# Altium footprint library ACTION_Connector.PcbLib: 123 footprints (part 7 of 8)
Each footprint in its own frame and in the unit in brackets; x right, y up, seen from the top. Pads: shape width x height; smd on the part's side, far side on the other; paste and mask are expansions set on the pad; w line width, h text height; cw(c..) or ccw(c..) is an arc to the next point about the centre after c.
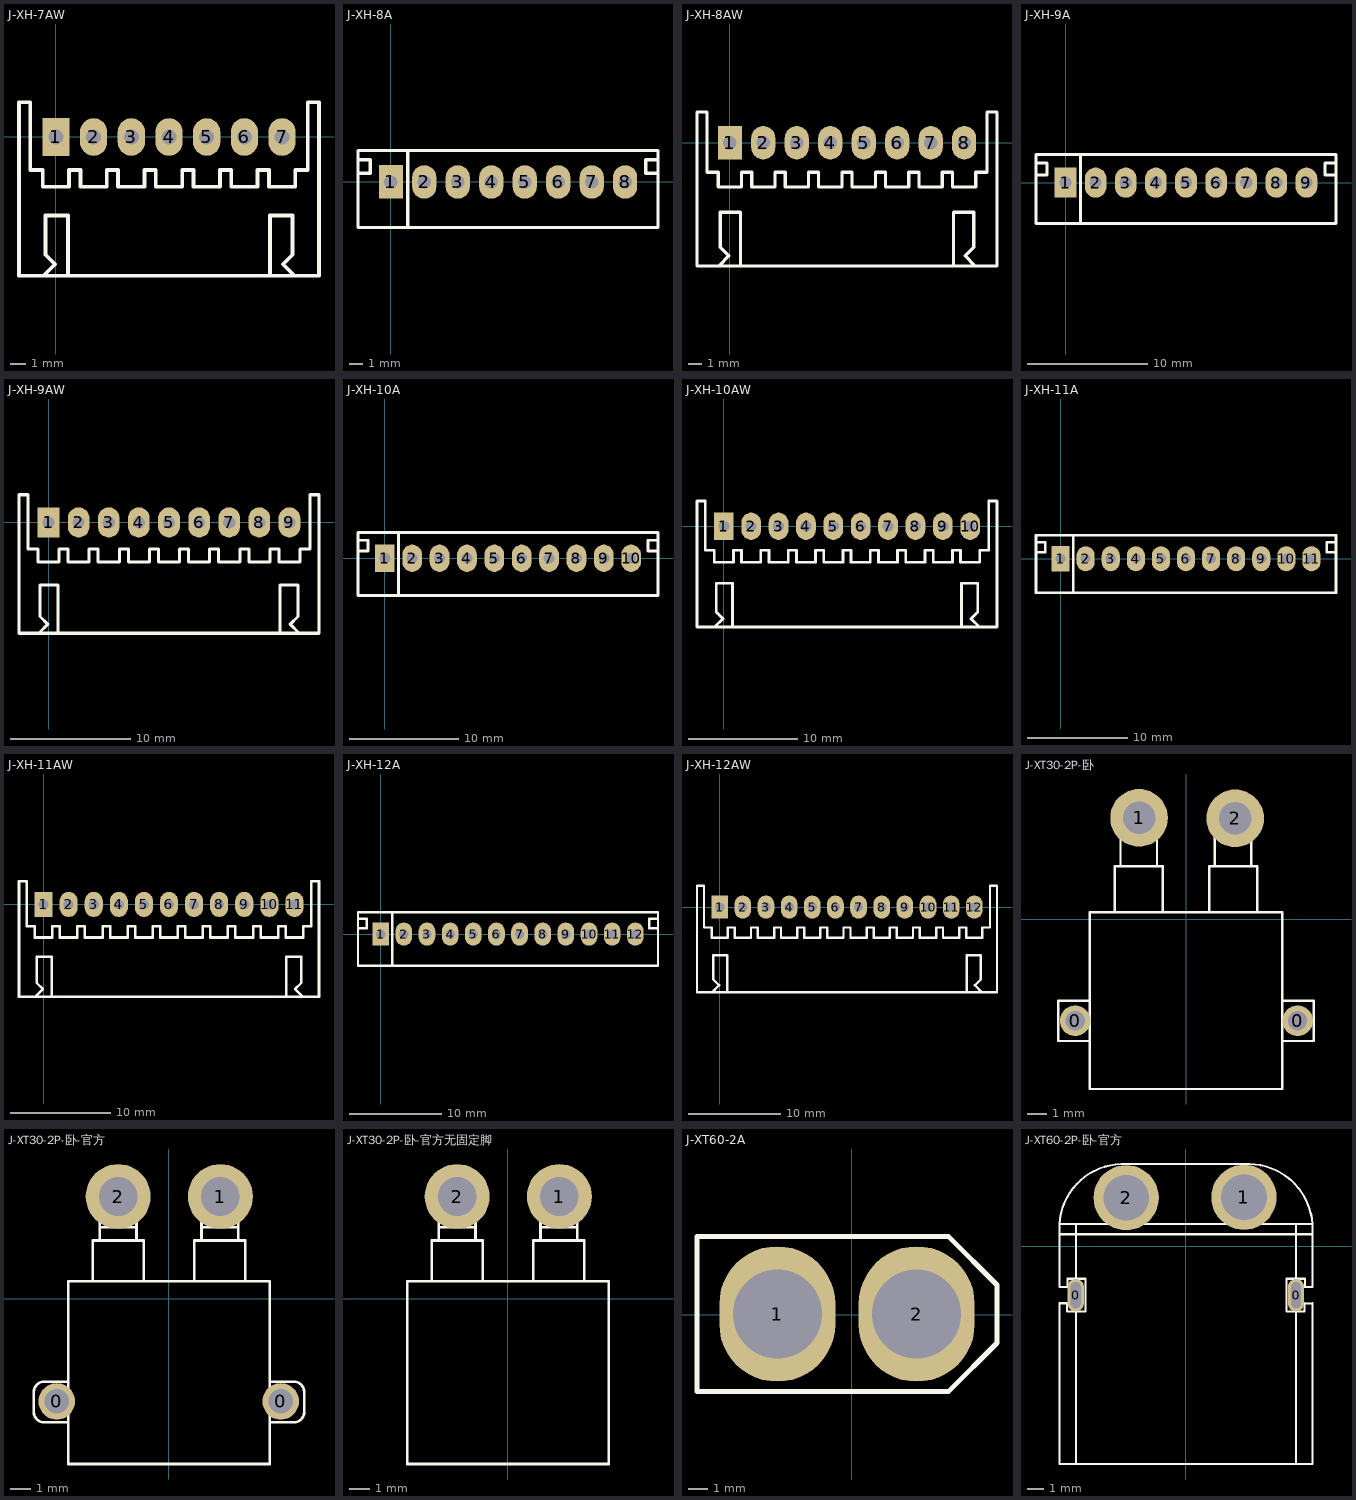
[diagram p6: the footprints below, top view; thin cyan lines are the x and y axes]

## J-XH-7AW [mm]
pads (7):
  rect 1.8x2.5 hole 1: 1(0,0)
  oval 1.8x2.5 hole 1: 2(2.5,0) 3(5,0) 4(7.5,0) 5(10,0) 6(12.5,0) 7(15,0)
Top Overlay:
  lines w0.254: -0.79,-9.172 -0.064,-8.445 -0.7,-7.809 -0.7,-5.2 0.8,-5.2 0.8,-9.2 ; 14.2,-9.2 14.2,-5.2 15.7,-5.2 15.7,-7.809 15.064,-8.445 15.79,-9.172 ; -2.45,-9.2 17.45,-9.2 17.45,2.3 16.7,2.3 16.7,-2.2 15.875,-2.2 15.875,-3.3 14.125,-3.3 14.125,-2.2 13.375,-2.2 13.375,-3.3 11.625,-3.3 11.625,-2.2 10.875,-2.2 10.875,-3.3 9.125,-3.3 9.125,-2.2 8.375,-2.2 8.375,-3.3 6.625,-3.3 6.625,-2.2 5.875,-2.2 5.875,-3.3 4.125,-3.3 4.125,-2.2 3.375,-2.2 3.375,-3.3 1.625,-3.3 1.625,-2.2 0.875,-2.2 0.875,-3.3 -0.875,-3.3 -0.875,-2.2 -1.7,-2.2 -1.7,2.3 -2.45,2.3 -2.45,-9.2
3D body "JST-S7B-XH-A.STEP": height 6.1, standoff -3.4, extent -2.45,-9.2 17.45,2.3

## J-XH-8A [mm]
pads (8):
  rect 1.8x2.5 hole 1: 1(0,0)
  oval 1.8x2.5 hole 1: 2(2.5,0) 3(5,0) 4(7.5,0) 5(10,0) 6(12.5,0) 7(15,0) 8(17.5,0)
Top Overlay:
  lines w0.254: -2.45,0.65 -1.524,0.65 -1.524,1.65 -2.45,1.65 ; 1.25,-3.4 1.25,2.35 ; 19.95,0.65 19.024,0.65 19.024,1.65 19.95,1.65 ; -2.45,-3.4 19.95,-3.4 19.95,2.35 -2.45,2.35 -2.45,-3.4
3D body "JST-B8B-XH-A.STEP": height 7, standoff -3.4, extent -2.45,-3.4 19.95,2.35

## J-XH-8AW [mm]
pads (8):
  rect 1.8x2.5 hole 1: 1(0,0)
  oval 1.8x2.5 hole 1: 2(2.5,0) 3(5,0) 4(7.5,0) 5(10,0) 6(12.5,0) 7(15,0) 8(17.5,0)
Top Overlay:
  lines w0.254: -0.79,-9.172 -0.064,-8.445 -0.7,-7.809 -0.7,-5.2 0.8,-5.2 0.8,-9.2 ; 16.7,-9.2 16.7,-5.2 18.2,-5.2 18.2,-7.809 17.564,-8.445 18.29,-9.172 ; -2.45,-9.2 19.95,-9.2 19.95,2.3 19.2,2.3 19.2,-2.2 18.375,-2.2 18.375,-3.3 16.625,-3.3 16.625,-2.2 15.875,-2.2 15.875,-3.3 14.125,-3.3 14.125,-2.2 13.375,-2.2 13.375,-3.3 11.625,-3.3 11.625,-2.2 10.875,-2.2 10.875,-3.3 9.125,-3.3 9.125,-2.2 8.375,-2.2 8.375,-3.3 6.625,-3.3 6.625,-2.2 5.875,-2.2 5.875,-3.3 4.125,-3.3 4.125,-2.2 3.375,-2.2 3.375,-3.3 1.625,-3.3 1.625,-2.2 0.875,-2.2 0.875,-3.3 -0.875,-3.3 -0.875,-2.2 -1.7,-2.2 -1.7,2.3 -2.45,2.3 -2.45,-9.2
3D body "JST-S8B-XH-A.STEP": height 6.1, standoff -3.4, extent -2.45,-9.2 19.95,2.3

## J-XH-9A [mm]
pads (9):
  rect 1.8x2.5 hole 1: 1(0,0)
  oval 1.8x2.5 hole 1: 2(2.5,0) 3(5,0) 4(7.5,0) 5(10,0) 6(12.5,0) 7(15,0) 8(17.5,0) 9(20,0)
Top Overlay:
  lines w0.254: -2.45,0.65 -1.524,0.65 -1.524,1.65 -2.45,1.65 ; 1.25,-3.4 1.25,2.35 ; 22.45,0.65 21.524,0.65 21.524,1.65 22.45,1.65 ; -2.45,-3.4 -2.45,2.35 22.45,2.35 22.45,-3.4 -2.45,-3.4
3D body "JST-B9B-XH-A.STEP": height 7, standoff -3.4, extent -2.45,-3.4 22.45,2.35

## J-XH-9AW [mm]
pads (9):
  rect 1.8x2.5 hole 1: 1(0,0)
  oval 1.8x2.5 hole 1: 2(2.5,0) 3(5,0) 4(7.5,0) 5(10,0) 6(12.5,0) 7(15,0) 8(17.5,0) 9(20,0)
Top Overlay:
  lines w0.254: -0.79,-9.172 -0.064,-8.445 -0.7,-7.809 -0.7,-5.2 0.8,-5.2 0.8,-9.2 ; 19.2,-9.2 19.2,-5.2 20.7,-5.2 20.7,-7.809 20.064,-8.445 20.79,-9.172 ; -2.45,-9.2 -2.45,2.3 -1.7,2.3 -1.7,-2.2 -0.875,-2.2 -0.875,-3.3 0.875,-3.3 0.875,-2.2 1.625,-2.2 1.625,-3.3 3.375,-3.3 3.375,-2.2 4.125,-2.2 4.125,-3.3 5.875,-3.3 5.875,-2.2 6.625,-2.2 6.625,-3.3 8.375,-3.3 8.375,-2.2 9.125,-2.2 9.125,-3.3 10.875,-3.3 10.875,-2.2 11.625,-2.2 11.625,-3.3 13.375,-3.3 13.375,-2.2 14.125,-2.2 14.125,-3.3 15.875,-3.3 15.875,-2.2 16.625,-2.2 16.625,-3.3 18.375,-3.3 18.375,-2.2 19.125,-2.2 19.125,-3.3 20.875,-3.3 20.875,-2.2 21.7,-2.2 21.7,2.3 22.45,2.3 22.45,-9.2 -2.45,-9.2
3D body "JST-S9B-XH-A.STEP": height 6.1, standoff -3.4, extent -2.45,-9.2 22.45,2.3

## J-XH-10A [mm]
pads (10):
  rect 1.8x2.5 hole 1: 1(0,0)
  oval 1.8x2.5 hole 1: 2(2.5,0) 3(5,0) 4(7.5,0) 5(10,0) 6(12.5,0) 7(15,0) 8(17.5,0) 9(20,0) 10(22.5,0)
Top Overlay:
  lines w0.254: -2.45,0.65 -1.524,0.65 -1.524,1.65 -2.45,1.65 ; 1.25,-3.4 1.25,2.35 ; 24.95,0.65 24.024,0.65 24.024,1.65 24.95,1.65 ; -2.45,-3.4 24.95,-3.4 24.95,2.35 -2.45,2.35 -2.45,-3.4
3D body "JST-B10B-XH-A.STEP": height 7, standoff -3.4, extent -2.45,-3.4 24.95,2.35

## J-XH-10AW [mm]
pads (10):
  rect 1.8x2.5 hole 1: 1(0,0)
  oval 1.8x2.5 hole 1: 2(2.5,0) 3(5,0) 4(7.5,0) 5(10,0) 6(12.5,0) 7(15,0) 8(17.5,0) 9(20,0) 10(22.5,0)
Top Overlay:
  lines w0.254: -0.79,-9.172 -0.064,-8.445 -0.7,-7.809 -0.7,-5.2 0.8,-5.2 0.8,-9.2 ; 21.7,-9.2 21.7,-5.2 23.2,-5.2 23.2,-7.809 22.564,-8.445 23.29,-9.172 ; -2.45,-9.2 24.95,-9.2 24.95,2.3 24.2,2.3 24.2,-2.2 23.375,-2.2 23.375,-3.3 21.625,-3.3 21.625,-2.2 20.875,-2.2 20.875,-3.3 19.125,-3.3 19.125,-2.2 18.375,-2.2 18.375,-3.3 16.625,-3.3 16.625,-2.2 15.875,-2.2 15.875,-3.3 14.125,-3.3 14.125,-2.2 13.375,-2.2 13.375,-3.3 11.625,-3.3 11.625,-2.2 10.875,-2.2 10.875,-3.3 9.125,-3.3 9.125,-2.2 8.375,-2.2 8.375,-3.3 6.625,-3.3 6.625,-2.2 5.875,-2.2 5.875,-3.3 4.125,-3.3 4.125,-2.2 3.375,-2.2 3.375,-3.3 1.625,-3.3 1.625,-2.2 0.875,-2.2 0.875,-3.3 -0.875,-3.3 -0.875,-2.2 -1.7,-2.2 -1.7,2.3 -2.45,2.3 -2.45,-9.2
3D body "JST-S10B-XH-A.STEP": height 6.1, standoff -3.4, extent -2.45,-9.2 24.95,2.3

## J-XH-11A [mm]
pads (11):
  rect 1.8x2.5 hole 1: 1(0,0)
  oval 1.8x2.5 hole 1: 2(2.5,0) 3(5,0) 4(7.5,0) 5(10,0) 6(12.5,0) 7(15,0) 8(17.5,0) 9(20,0) 10(22.5,0) 11(25,0)
Top Overlay:
  lines w0.254: -2.45,0.65 -1.524,0.65 -1.524,1.65 -2.45,1.65 ; 1.25,-3.4 1.25,2.35 ; 27.45,0.65 26.524,0.65 26.524,1.65 27.45,1.65 ; -2.45,-3.4 -2.45,2.35 27.45,2.35 27.45,-3.4 -2.45,-3.4
3D body "JST-B11B-XH-A.STEP": height 7, standoff -3.4, extent -2.45,-3.4 27.45,2.35

## J-XH-11AW [mm]
pads (11):
  rect 1.8x2.5 hole 1: 1(0,0)
  oval 1.8x2.5 hole 1: 2(2.5,0) 3(5,0) 4(7.5,0) 5(10,0) 6(12.5,0) 7(15,0) 8(17.5,0) 9(20,0) 10(22.5,0) 11(25,0)
Top Overlay:
  lines w0.254: -0.79,-9.172 -0.064,-8.445 -0.7,-7.809 -0.7,-5.2 0.8,-5.2 0.8,-9.2 ; 24.2,-9.2 24.2,-5.2 25.7,-5.2 25.7,-7.809 25.064,-8.445 25.79,-9.172 ; -2.45,-9.2 27.45,-9.2 27.45,2.3 26.7,2.3 26.7,-2.2 25.875,-2.2 25.875,-3.3 24.125,-3.3 24.125,-2.2 23.375,-2.2 23.375,-3.3 21.625,-3.3 21.625,-2.2 20.875,-2.2 20.875,-3.3 19.125,-3.3 19.125,-2.2 18.375,-2.2 18.375,-3.3 16.625,-3.3 16.625,-2.2 15.875,-2.2 15.875,-3.3 14.125,-3.3 14.125,-2.2 13.375,-2.2 13.375,-3.3 11.625,-3.3 11.625,-2.2 10.875,-2.2 10.875,-3.3 9.125,-3.3 9.125,-2.2 8.375,-2.2 8.375,-3.3 6.625,-3.3 6.625,-2.2 5.875,-2.2 5.875,-3.3 4.125,-3.3 4.125,-2.2 3.375,-2.2 3.375,-3.3 1.625,-3.3 1.625,-2.2 0.875,-2.2 0.875,-3.3 -0.875,-3.3 -0.875,-2.2 -1.7,-2.2 -1.7,2.3 -2.45,2.3 -2.45,-9.2
3D body "JST-S11B-XH-A.STEP": height 6.1, standoff -3.4, extent -2.45,-9.2 27.45,2.3

## J-XH-12A [mm]
pads (12):
  rect 1.8x2.5 hole 1: 1(0,0)
  oval 1.8x2.5 hole 1: 2(2.5,0) 3(5,0) 4(7.5,0) 5(10,0) 6(12.5,0) 7(15,0) 8(17.5,0) 9(20,0) 10(22.5,0) 11(25,0) 12(27.5,0)
Top Overlay:
  lines w0.254: -2.45,0.65 -1.524,0.65 -1.524,1.65 -2.45,1.65 ; 1.25,-3.4 1.25,2.35 ; 29.95,0.65 29.024,0.65 29.024,1.65 29.95,1.65 ; -2.45,-3.4 29.95,-3.4 29.95,2.35 -2.45,2.35 -2.45,-3.4
3D body "JST-B12B-XH-A.STEP": height 7, standoff -3.4, extent -2.45,-3.4 29.95,2.35

## J-XH-12AW [mm]
pads (12):
  rect 1.8x2.5 hole 1: 1(0,0)
  oval 1.8x2.5 hole 1: 2(2.5,0) 3(5,0) 4(7.5,0) 5(10,0) 6(12.5,0) 7(15,0) 8(17.5,0) 9(20,0) 10(22.5,0) 11(25,0) 12(27.5,0)
Top Overlay:
  lines w0.254: -0.79,-9.172 -0.064,-8.445 -0.7,-7.809 -0.7,-5.2 0.8,-5.2 0.8,-9.2 ; 26.7,-9.2 26.7,-5.2 28.2,-5.2 28.2,-7.809 27.564,-8.445 28.29,-9.172 ; -2.45,-9.2 29.95,-9.2 29.95,2.3 29.2,2.3 29.2,-2.2 28.375,-2.2 28.375,-3.3 26.625,-3.3 26.625,-2.2 25.875,-2.2 25.875,-3.3 24.125,-3.3 24.125,-2.2 23.375,-2.2 23.375,-3.3 21.625,-3.3 21.625,-2.2 20.875,-2.2 20.875,-3.3 19.125,-3.3 19.125,-2.2 18.375,-2.2 18.375,-3.3 16.625,-3.3 16.625,-2.2 15.875,-2.2 15.875,-3.3 14.125,-3.3 14.125,-2.2 13.375,-2.2 13.375,-3.3 11.625,-3.3 11.625,-2.2 10.875,-2.2 10.875,-3.3 9.125,-3.3 9.125,-2.2 8.375,-2.2 8.375,-3.3 6.625,-3.3 6.625,-2.2 5.875,-2.2 5.875,-3.3 4.125,-3.3 4.125,-2.2 3.375,-2.2 3.375,-3.3 1.625,-3.3 1.625,-2.2 0.875,-2.2 0.875,-3.3 -0.875,-3.3 -0.875,-2.2 -1.7,-2.2 -1.7,2.3 -2.45,2.3 -2.45,-9.2
3D body "JST-S12B-XH-A.STEP": height 6.1, standoff -3.4, extent -2.45,-9.2 29.95,2.3

## J-XT30-2P-卧 [mm]
pads (4):
  round 1.6 hole 1: 0(-5.791,-5.283) 0(5.791,-5.283)
  round 3 hole 1.7: 1(-2.464,5.283) 2(2.54,5.258)
Top Overlay:
  lines w0.127: -5.021,-6.336 -6.671,-6.336 -6.671,-4.236 -5.021,-4.236 ; -3.721,0.364 -3.721,2.764 -1.221,2.764 -1.221,0.364 ; -3.431,2.764 -3.431,5.22 cw(c-2.481,5.22) -1.531,5.22 -1.531,2.764 ; 1.179,0.364 1.179,2.764 3.679,2.764 3.679,0.364 ; 1.479,2.764 1.479,5.214 cw(c2.429,5.214) 3.379,5.214 3.379,2.764 ; 4.979,-6.336 6.629,-6.336 6.629,-4.236 4.979,-4.236 ; -5.021,-8.836 -5.021,0.364 4.979,0.364 4.979,-8.836 -5.021,-8.836
3D body "User Library-XT30- curved.STEP": height 5, standoff -2.1, extent -6.579,-8.839 6.721,6.166

## J-XT30-2P-卧-官方 [mm]
pads (4):
  round 1.8 hole 1.2: 0(-5.512,-5.042) 0(5.512,-5.042)
  round 3.2 hole 1.9: 1(2.54,5.042) 2(-2.489,5.042)
Top Overlay:
  circle w0.127: c-5.488,-5.073 r0.55
  circle w0.127: c-5.488,-5.073 r0.5
  circle w0.127: c5.512,-5.073 r0.5
  circle w0.127: c2.513,4.937 r0.5
  circle w0.127: c2.513,4.937 r0.8
  circle w0.127: c-2.487,4.937 r0.5
  circle w0.127: c-2.487,4.937 r0.8
  lines w0.127: -4.938,-6.073 -6.138,-6.073 cw(c-6.138,-5.573) -6.638,-5.573 -6.638,-4.573 cw(c-6.138,-4.573) -6.138,-4.073 -4.938,-4.073 ; -3.738,0.877 -3.738,2.877 -1.238,2.877 -1.238,0.877 ; -3.388,2.877 -3.388,3.527 ; -1.588,2.877 -1.588,3.527 ; 1.262,0.877 1.262,2.877 3.762,2.877 3.762,0.877 ; 1.612,4.927 cw(c2.512,4.927) 3.412,4.927 3.412,3.527 ; 1.612,2.877 1.612,3.527 ; 1.612,4.927 1.612,3.527 ; 3.412,2.877 3.412,3.527 ; 4.962,-6.073 6.162,-6.073 ccw(c6.162,-5.573) 6.662,-5.573 6.662,-4.573 ccw(c6.162,-4.573) 6.162,-4.073 4.962,-4.073 ; -3.388,3.527 -1.588,3.527 ; -3.388,3.527 -3.388,4.927 cw(c-2.488,4.927) -1.588,4.927 -1.588,3.527 ; 1.612,3.527 3.412,3.527 ; -4.938,-8.123 -4.938,0.877 -4.038,0.877 4.062,0.877 4.962,0.877 4.962,-8.123 4.062,-8.123 -4.038,-8.123 -4.938,-8.123
3D body "XT30PW-M 3D DRAWING.STEP": height 5.35, standoff -1.85, extent -6.675,-8.077 6.625,5.873

## J-XT30-2P-卧-官方无固定脚 [mm]
pads (2):
  round 3.2 hole 1.9: 1(2.54,5.042) 2(-2.489,5.042)
Top Overlay:
  circle w0.127: c2.513,4.937 r0.5
  circle w0.127: c2.513,4.937 r0.8
  circle w0.127: c-2.487,4.937 r0.5
  circle w0.127: c-2.487,4.937 r0.8
  lines w0.127: -3.738,0.877 -3.738,2.877 -1.238,2.877 -1.238,0.877 ; -3.388,2.877 -3.388,3.527 ; -1.588,2.877 -1.588,3.527 ; 1.262,0.877 1.262,2.877 3.762,2.877 3.762,0.877 ; 1.612,4.927 cw(c2.512,4.927) 3.412,4.927 3.412,3.527 ; 1.612,2.877 1.612,3.527 ; 1.612,4.927 1.612,3.527 ; 3.412,2.877 3.412,3.527 ; -3.388,3.527 -1.588,3.527 ; -3.388,3.527 -3.388,4.927 cw(c-2.488,4.927) -1.588,4.927 -1.588,3.527 ; 1.612,3.527 3.412,3.527 ; -4.938,-8.123 -4.938,0.877 -4.038,0.877 4.062,0.877 4.962,0.877 4.962,-8.123 4.062,-8.123 -4.038,-8.123 -4.938,-8.123
3D body "XT30PW-M 3D DRAWING 214.STEP": height 5.35, standoff -1.85, extent -6.645,-8.169 6.655,5.781

## J-XT60-2A [mm]
height 1.75
pads (2):
  oval 6x7 hole 4.6: 1(-3.854,0.051) 2(3.346,0.051)
Top Overlay:
  lines w0.254: -8.004,4.05 -8.004,-3.962 5.004,-3.962 ; -8.004,4.064 5.004,4.064 5.004,4.043 7.496,1.551 ; 5.004,-3.941 7.496,-1.449 ; 7.496,-1.449 7.496,1.551 ; 7.496,-1.449 7.496,1.551
3D body: height 16, standoff 0, extent -8.103,-4.013 7.544,4.115

## J-XT60-2P-卧-官方 [mm]
pads (4):
  oval 1x2 hole 0.6 slot 1.6 at 90 deg: 0(-6.75,-2.999) 0(6.75,-2.999)
  round 4 hole 2.8: 1(3.556,2.999) 2(-3.658,2.973)
Top Overlay:
  circle w0.127: c3.595,2.998 r1.25
  circle w0.127: c3.595,2.998 r0.961
  circle w0.127: c-3.605,2.998 r1.25
  circle w0.127: c-3.605,2.998 r0.961
  lines w0.127: -7.252,-2.494 -7.252,-1.994 -6.745,-1.994 ; -7.095,0.706 -7.095,0.756 ; -7.055,-2.503 -7.745,-2.503 -7.745,0.706 ; -5.595,0.706 -5.595,0.756 ; 5.605,0.706 5.605,0.756 ; 7.045,-3.503 7.745,-3.503 ; 7.045,-3.498 7.252,-3.498 7.745,-3.498 ; 7.045,-2.503 7.745,-2.503 ; 7.045,-2.498 7.286,-2.498 7.745,-2.498 ; 7.105,0.706 7.105,0.756 ; 7.263,-3.494 7.263,-3.994 6.755,-3.994 ; 7.297,-2.494 7.297,-1.994 6.755,-1.994 ; 7.557,1.356 7.557,1.358 ; 7.755,-3.494 7.755,-13.344 6.755,-13.344 ; 7.755,-2.494 7.755,0.706 ; -7.745,0.706 -7.745,0.756 ; -7.745,0.706 -6.745,0.706 ; -7.745,0.756 -7.745,1.356 ; -7.745,0.756 -6.745,0.756 ; -7.745,1.356 cw(c-3.852,1.136) -3.632,5.029 3.556,5.029 cw(c3.819,1.093) 7.755,1.356 ; -7.745,1.356 -6.745,1.356 ; -6.745,-13.344 -7.745,-13.344 -7.745,-3.494 -7.286,-3.494 -7.286,-3.994 -6.745,-3.994 ; -6.745,-13.344 -6.745,-3.994 ; -6.745,-13.344 6.755,-13.344 ; -6.745,-3.994 -6.145,-3.994 -6.145,-1.994 -6.745,-1.994 ; -6.745,-1.994 -6.745,0.706 ; -6.745,0.706 6.755,0.706 ; -6.745,0.756 6.755,0.756 ; -6.745,0.756 -6.745,1.356 ; -6.745,1.356 6.755,1.356 ; 6.755,-13.344 6.755,-3.994 ; 6.755,-3.994 6.155,-3.994 6.155,-1.994 6.755,-1.994 ; 6.755,-1.994 6.755,0.706 ; 6.755,0.706 7.755,0.706 ; 6.755,0.756 7.755,0.756 ; 6.755,0.756 6.755,1.356 ; 6.755,1.356 7.755,1.356 ; 7.755,0.706 7.755,0.756 ; 7.755,0.756 7.755,1.356
3D body "XT60PW-M 3D DRAWING.STEP": height 8.7, standoff -1.8, extent -7.95,-13.417 7.95,4.883